# Altium footprint library IntegratedPcbLib.PcbLib: 81 footprints (part 4 of 6)
Each footprint in its own frame and in the unit in brackets; x right, y up, seen from the top. Pads: shape width x height; smd on the part's side, far side on the other; paste and mask are expansions set on the pad; w line width, h text height; cw(c..) or ccw(c..) is an arc to the next point about the centre after c.
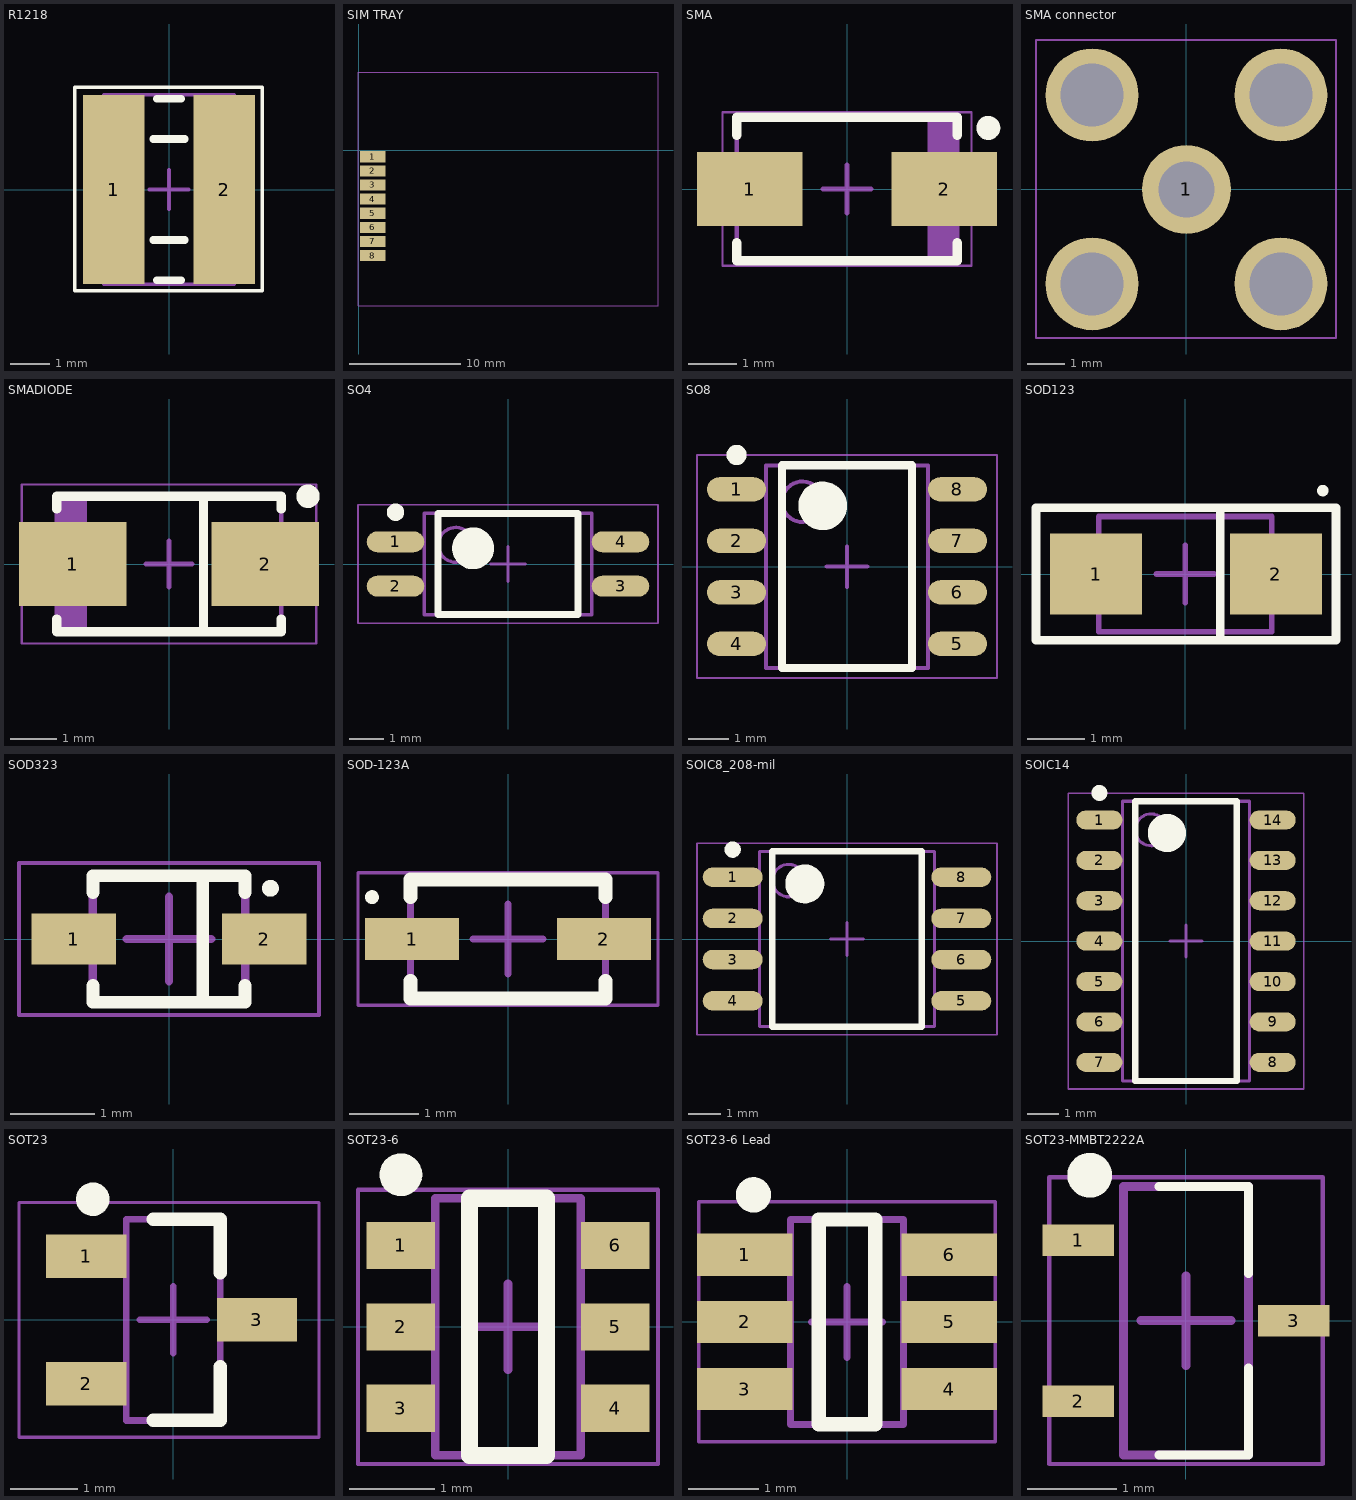
[diagram p3: the footprints below, top view; thin cyan lines are the x and y axes]

## R1218 [mm] "Chip Resistor, 2-Leads, Body 3,10x4,60mm, IPC Medium Density"
height 0.7
pads (2):
  rect 1.55x4.8 smd: 1(-1.4,0) 2(1.4,0)
Top Overlay:
  lines w0.1: -2.388,-2.565 2.362,-2.565 2.362,2.591 -2.388,2.591 -2.388,-2.565
  lines w0.2: -0.4,-1.275 0.4,-1.275 ; -0.4,1.275 0.4,1.275 ; -0.3,-2.3 0.3,-2.3 ; -0.3,2.3 0.3,2.3
Mechanical 13:
  lines w0.1: -1.65,-2.4 -1.65,2.4 1.65,2.4 1.65,-2.4 -1.65,-2.4
Mechanical 15:
  lines w0.1: -0.5,0 0.5,0 ; 0,-0.5 0,0.5
3D body "RESC3146X07N.step": height 0.7, standoff 0, extent -1.65,-2.4 1.65,2.4

## SIM TRAY [mm] "47553-0001 MOLEX SIM TRAY"
pads (8):
  rect 2.3x1 smd: 1(1.25,-0.6) 2(1.25,-1.875) 3(1.25,-3.15) 4(1.25,-4.425) 5(1.25,-5.7) 6(1.25,-6.975) 7(1.25,-8.25) 8(1.25,-9.525)
Mechanical 15:
  lines w0.05: -0.075,-14.075 -0.075,7.05 27.025,7.05 27.025,-14.075 -0.075,-14.075
3D body "475530001.stp": height 1.94, standoff 0.11, extent 0.4,-14 26.9,6.95

## SMA [mm] "Molded Diode, 2-Leads, Body 4,28x2,60mm, IPC High Density"
height 2.03
pads (2):
  rect 2.2x1.55 smd: 1(-2.032,0) 2(2.032,0)
Top Overlay:
  circle w0.25: c2.95,1.275 r0.125
  lines w0.2: -2.3,-1.125 -2.3,-1.5 2.3,-1.5 2.3,-1.125 ; -2.3,1.125 -2.3,1.5 2.3,1.5 2.3,1.125
Mechanical 13:
  rectangle: 1.681,-1.475 2.3,1.475
  lines w0.1: -2.3,-1.475 -2.3,1.475 2.3,1.475 2.3,-1.475 -2.3,-1.475
Mechanical 15:
  lines w0.05: -2.6,-1.6 -2.6,1.6 2.6,1.6 2.6,-1.6 -2.6,-1.6
  lines w0.1: -0.5,0 0.5,0 ; 0,-0.5 0,0.5
3D body "User Library-DO-214AC SMA.step": height 2.45, standoff 0.05, extent -2.6,-1.3 2.6,1.3

## SMA connector [mm] "SMA antena connector"
pads (5):
  round 2.4 hole 1.5: 1(0,0)
  round 2.5 hole 1.7: ""(-2.54,-2.54) ""(-2.54,2.54) ""(2.54,-2.54) ""(2.54,2.54)
Mechanical 15:
  lines w0.05: -4.05,-4 4.025,-4 4.025,4.025 -4.05,4.025 -4.05,-4
3D body "User Library-SMA_Stehend_Amp 132134RP-1.STEP": height 9.63, standoff -3.84, extent -3.5,-3.5 3.5,3.5

## SMADIODE [mm] "Molded Diode, 2-Leads, Body 4,50x2,65mm, IPC Medium Density"
height 2.4
pads (2):
  rect 2.3x1.8 smd: 1(-2.057,0) 2(2.057,0)
Top Overlay:
  circle w0.25: c2.972,1.448 r0.125
  lines w0.2: -2.4,-1.175 -2.4,-1.45 2.4,-1.45 2.4,-1.175 ; -2.4,1.175 -2.4,1.45 2.4,1.45 2.4,1.175 ; 0.737,-1.422 0.737,1.422
Mechanical 13:
  rectangle: -2.4,-1.45 -1.754,1.45
  lines w0.1: -2.4,-1.45 -2.4,1.45 2.4,1.45 2.4,-1.45 -2.4,-1.45
Mechanical 15:
  lines w0.05: -3.15,-1.7 -3.15,1.7 3.15,1.7 3.15,-1.7 -3.15,-1.7
  lines w0.1: -0.5,0 0.5,0 ; 0,-0.5 0,0.5
3D body "DIOM4526X24N.step": height 2.4, standoff 0, extent -2.62,-1.45 2.62,1.45

## SO4 [mm]
height 2.2
pads (4):
  oval 1.65x0.6 smd: 1(-3.225,0.635) 2(-3.225,-0.635) 3(3.225,-0.635) 4(3.225,0.635)
Top Overlay:
  circle w0.6: c-1,0.45 r0.3
  circle w0.25: c-3.225,1.485 r0.125
  lines w0.2: -2,-1.45 2,-1.45 2,1.45 -2,1.45 -2,-1.45
Mechanical 13:
  circle w0.1: c-1.5,0.55 r0.5
  lines w0.1: -2.4,-1.45 2.4,-1.45 2.4,1.45 -2.4,1.45 -2.4,-1.45
Mechanical 15:
  lines w0.05: -4.3,-1.7 4.3,-1.7 4.3,1.7 -4.3,1.7 -4.3,-1.7
  lines w0.1: -0.5,0 0.5,0 ; 0,-0.5 0,0.5
3D body "User Library-TLP290.step": height 2.1, standoff 0.01, extent -3.5,-1.3 3.5,1.3

## SO8 [mm] "SO8 8-Leads, Body 4,90x3,90mm, Pitch 1,27mm, IPC Medium Density"
height 1.75
pads (8):
  oval 1.45x0.6 smd: 1(-2.725,1.905) 2(-2.725,0.635) 3(-2.725,-0.635) 4(-2.725,-1.905) 5(2.725,-1.905) 6(2.725,-0.635) 7(2.725,0.635) 8(2.725,1.905)
Top Overlay:
  circle w0.6: c-0.6,1.5 r0.3
  circle w0.25: c-2.725,2.755 r0.125
  lines w0.2: -1.6,-2.5 1.6,-2.5 1.6,2.5 -1.6,2.5 -1.6,-2.5
Mechanical 13:
  circle w0.1: c-1.1,1.6 r0.5
  lines w0.1: -2,-2.5 2,-2.5 2,2.5 -2,2.5 -2,-2.5
Mechanical 15:
  lines w0.05: -3.7,-2.75 3.7,-2.75 3.7,2.75 -3.7,2.75 -3.7,-2.75
  lines w0.1: -0.5,0 0.5,0 ; 0,-0.5 0,0.5
3D body "User Library-SOIC-8-1(1).step": height 1.75, standoff 0, extent -3.025,-2.45 2.975,2.45

## SOD123 [mm] "SODFL, 2-Leads, Body 1,90x3,70mm, IPC Medium Density"
height 1.1
pads (2):
  rect 1.6x1.4 smd: 1(-1.549,0) 2(1.575,0)
Top Overlay:
  circle w0.1: c2.388,1.448 r0.05
  lines w0.15: 0.61,-1.092 0.61,1.092 ; -2.591,-1.15 -2.591,1.15 2.616,1.15 2.616,-1.15 -2.591,-1.15
Mechanical 13:
  lines w0.1: -1.5,-1 1.5,-1 1.5,1 -1.5,1 -1.5,-1
Mechanical 15:
  lines w0.1: -0.5,0 0.5,0 ; 0,-0.5 0,0.5
3D body "SODFL370X110-2N.step": height 1.1, standoff 0, extent -1.85,-1 1.85,1

## SOD323 [mm] "SODFL, 2-Leads, Body 1,28x2,50mm, IPC Medium Density"
height 1.1
pads (2):
  rect 1x0.6 smd: 1(-1.125,0) 2(1.125,0)
Top Overlay:
  circle w0.1: c1.2,0.6 r0.05
  lines w0.15: -0.9,-0.55 -0.9,-0.75 0.9,-0.75 0.9,-0.55 ; -0.9,0.55 -0.9,0.75 0.9,0.75 0.9,0.55 ; 0.4,-0.74 0.4,0.74
Mechanical 13:
  lines w0.1: -0.9,-0.725 -0.9,0.725 0.9,0.725 0.9,-0.725 -0.9,-0.725
Mechanical 15:
  lines w0.05: -1.775,-0.9 -1.775,0.9 1.775,0.9 1.775,-0.9 -1.775,-0.9
  lines w0.1: -0.5,0 0.5,0 ; 0,-0.5 0,0.5
3D body "SOD323.step": height 1.1, standoff 0, extent -1.25,-0.725 1.25,0.725

## SOD-123A [mm] "SOD-123A, 2-Leads, Body 1,60x3,70mm, IPC High Density"
height 1.25
pads (2):
  rect 1.35x0.6 smd: 1(-1.375,0) 2(1.375,0)
Top Overlay:
  circle w0.1: c-1.95,0.6 r0.05
  lines w0.2: -1.4,-0.6 -1.4,-0.85 1.4,-0.85 1.4,-0.6 ; -1.4,0.6 -1.4,0.85 1.4,0.85 1.4,0.6
Mechanical 13:
  lines w0.1: -1.4,-0.85 1.4,-0.85 1.4,0.85 -1.4,0.85 -1.4,-0.85
Mechanical 15:
  lines w0.05: -2.15,-0.95 2.15,-0.95 2.15,0.95 -2.15,0.95 -2.15,-0.95
  lines w0.1: -0.5,0 0.5,0 ; 0,-0.5 0,0.5
3D body "User Library-SOD-123_DiodesInc.step": height 1.42, standoff -0.03, extent -1.925,-0.85 1.925,0.85

## SOIC8_208-mil [mm]
height 2.16
pads (8):
  oval 1.85x0.6 smd: 1(-3.525,1.905) 2(-3.525,0.635) 3(-3.525,-0.635) 4(-3.525,-1.905) 5(3.525,-1.905) 6(3.525,-0.635) 7(3.525,0.635) 8(3.525,1.905)
Top Overlay:
  circle w0.25: c-3.525,2.755 r0.125
  circle w0.6: c-1.3,1.7 r0.3
  lines w0.2: -2.3,-2.7 -2.3,2.7 2.3,2.7 2.3,-2.7 -2.3,-2.7
Mechanical 13:
  circle w0.1: c-1.8,1.8 r0.5
  lines w0.1: -2.7,-2.7 -2.7,2.7 2.7,2.7 2.7,-2.7 -2.7,-2.7
Mechanical 15:
  lines w0.05: -4.625,-2.95 -4.625,2.95 4.625,2.95 4.625,-2.95 -4.625,-2.95
  lines w0.1: -0.5,0 0.5,0 ; 0,-0.5 0,0.5
3D body "User Library-SOIC-8-208.STEP": height 2.15, standoff 0, extent -4.075,-2.7 4.125,2.7

## SOIC14 [mm]
height 1.75
pads (14):
  oval 1.45x0.6 smd: 1(-2.725,3.81) 2(-2.725,2.54) 3(-2.725,1.27) 4(-2.725,0) 5(-2.725,-1.27) 6(-2.725,-2.54) 7(-2.725,-3.81) 8(2.725,-3.81) 9(2.725,-2.54) 10(2.725,-1.27) 11(2.725,0) 12(2.725,1.27) 13(2.725,2.54) 14(2.725,3.81)
Top Overlay:
  circle w0.6: c-0.6,3.4 r0.3
  circle w0.25: c-2.725,4.66 r0.125
  lines w0.2: -1.6,-4.4 1.6,-4.4 1.6,4.4 -1.6,4.4 -1.6,-4.4
Mechanical 13:
  circle w0.1: c-1.1,3.5 r0.5
  lines w0.1: -2,-4.4 2,-4.4 2,4.4 -2,4.4 -2,-4.4
Mechanical 15:
  lines w0.05: -3.7,-4.65 3.7,-4.65 3.7,4.65 -3.7,4.65 -3.7,-4.65
  lines w0.1: -0.5,0 0.5,0 ; 0,-0.5 0,0.5
3D body "User Library-SOIC-14.step": height 1.75, standoff 0, extent -3,-4.375 3,4.375

## SOT23 [mm] "SOT23, 3-Leads, Body 2,90x2,45mm, Pitch 0,95mm, IPC Medium Density"
height 1.1
pads (3):
  rect 1.2x0.65 smd: 1(-1.3,0.95) 2(-1.3,-0.95) 3(1.25,0)
Top Overlay:
  circle w0.25: c-1.2,1.8 r0.125
  lines w0.2: -0.3,-1.5 0.7,-1.5 0.7,-0.7 ; -0.3,1.5 0.7,1.5 0.7,0.7
Mechanical 13:
  lines w0.1: -0.7,-1.5 0.7,-1.5 0.7,1.5 -0.7,1.5 -0.7,-1.5
Mechanical 15:
  lines w0.05: -2.3,-1.75 2.175,-1.75 2.175,1.75 -2.3,1.75 -2.3,-1.75
  lines w0.1: -0.5,0 0.5,0 ; 0,-0.5 0,0.5
3D body "SOT95P245X110-3N.step": height 1.1, standoff 0, extent -1.3,-1.5 1.3,1.5

## SOT23-6 [mm] "SOT23, 6-Leads, Body 2,90x2,80mm, Pitch 0,95mm, IPC High Density"
height 1.45
pads (6):
  rect 0.8x0.55 smd: 1(-1.25,0.95) 2(-1.25,0) 3(-1.25,-0.95) 4(1.25,-0.95) 5(1.25,0) 6(1.25,0.95)
Top Overlay:
  circle w0.25: c-1.25,1.775 r0.125
  lines w0.2: -0.45,-1.5 0.45,-1.5 0.45,1.5 -0.45,1.5 -0.45,-1.5
Mechanical 13:
  lines w0.1: -0.85,-1.5 -0.85,1.5 0.85,1.5 0.85,-1.5 -0.85,-1.5
Mechanical 15:
  lines w0.05: -1.75,-1.6 -1.75,1.6 1.75,1.6 1.75,-1.6 -1.75,-1.6
  lines w0.1: -0.5,0 0.5,0 ; 0,-0.5 0,0.5
3D body "User Library-SOT23-6-2.step": height 1.45, standoff 0, extent -1.4,-1.45 1.4,1.45

## SOT23-6 Lead [mm] "SOT23, 6-Leads, Body 2,85x2,80mm, Pitch 0,95mm, IPC Medium Density"
height 1.45
pads (6):
  rect 1.35x0.6 smd: 1(-1.45,0.95) 2(-1.45,0) 3(-1.45,-0.95) 4(1.45,-0.95) 5(1.45,0) 6(1.45,0.95)
Top Overlay:
  circle w0.25: c-1.325,1.8 r0.125
  lines w0.2: -0.4,-1.45 -0.4,1.45 0.4,1.45 0.4,-1.45 -0.4,-1.45
Mechanical 13:
  lines w0.1: -0.8,-1.45 0.8,-1.45 0.8,1.45 -0.8,1.45 -0.8,-1.45
Mechanical 15:
  lines w0.05: -2.1,-1.7 2.1,-1.7 2.1,1.7 -2.1,1.7 -2.1,-1.7
  lines w0.1: -0.5,0 0.5,0 ; 0,-0.5 0,0.5
3D body "SOT95P280X145-6N.step": height 1.45, standoff 0, extent -1.5,-1.45 1.5,1.45

## SOT23-MMBT2222A [mm]
height 1.1
pads (3):
  rect 0.8x0.35 smd: 1(-1.202,0.9) 2(-1.202,-0.9) 3(1.202,0)
Top Overlay:
  circle w0.25: c-1.075,1.625 r0.125
  lines w0.1: -0.3,-1.5 0.7,-1.5 0.7,-0.525 ; -0.3,1.5 0.7,1.5 0.7,0.525
Mechanical 13:
  lines w0.1: -0.7,-1.5 0.7,-1.5 0.7,1.5 -0.7,1.5 -0.7,-1.5
Mechanical 15:
  lines w0.05: -1.525,-1.6 1.525,-1.6 1.525,1.6 -1.525,1.6 -1.525,-1.6
  lines w0.1: -0.5,0 0.5,0 ; 0,-0.5 0,0.5
3D body "User Library-SOT23-3.step": height 1.3, standoff 0, extent -1.4,-1.45 1.4,1.45